# Altium schematic symbol library Analog Devices Data Converters Digital-to-Analog Converters.SchLib: 2231 symbols (part 84 of 135) (continued)
## AD5821ABCBZ-REEL (continued)
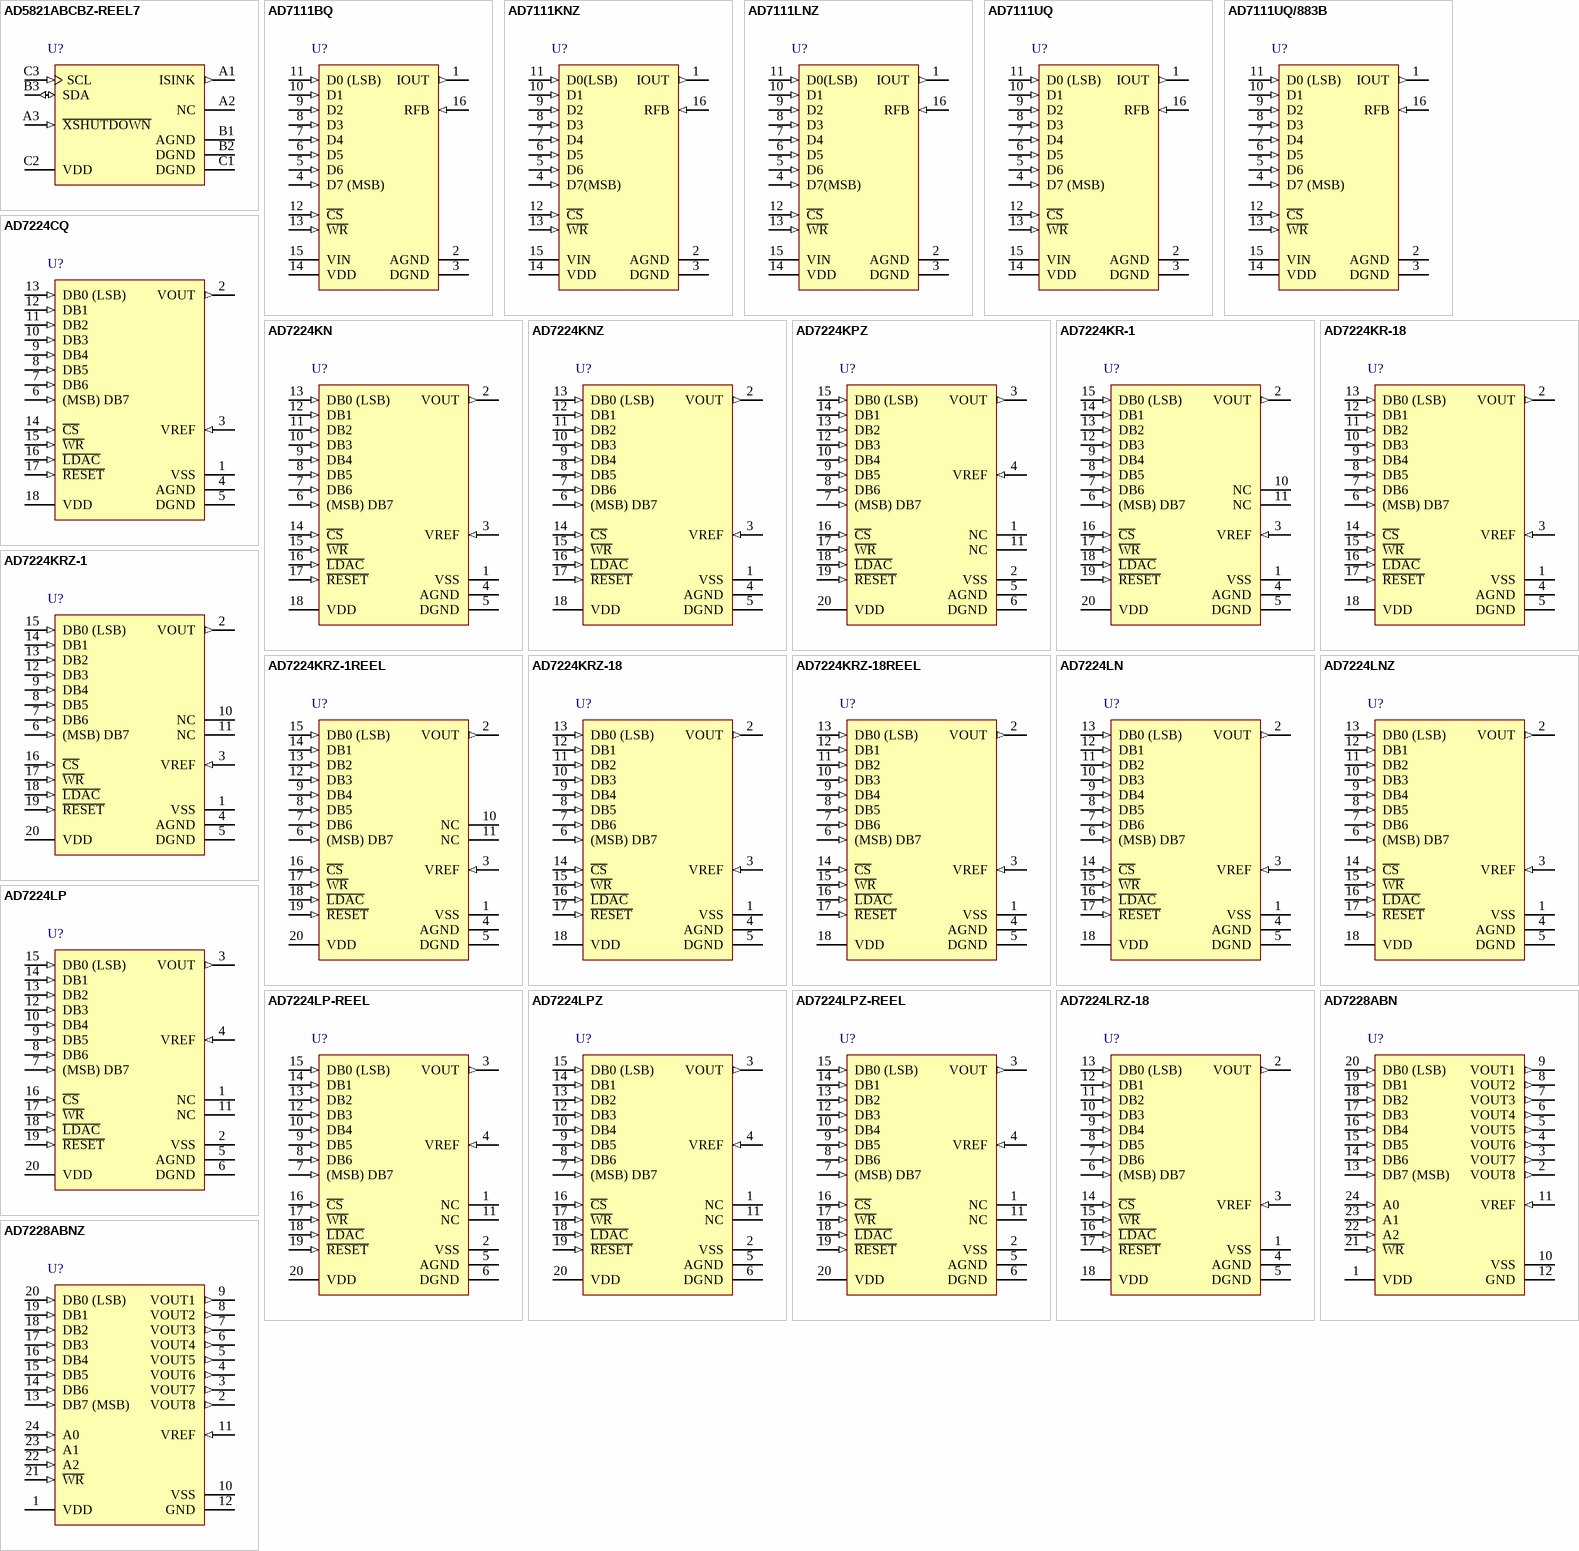
[diagram p58: symbols AD5821ABCBZ-REEL7 to AD7228ABNZ]

## AD5821ABCBZ-REEL7
designator U?
Single 10-Bit Current Sinking Digital-to-Analog Converter with I2C Interface, 120 mA, 0 to +70 degC, CB-9-1, Pb-Free, Reel; Generic Part Number: AD5821A; Manufacturer: Analog Devices; PartNumber: AD5821ABCBZ-REEL7; # DAC Outputs: 1; Max V+: 5.5V; Op Pwr Diss: 5mW; Resolution (Bits): 10; Settling Time: 250µs; DatasheetVersion: Rev.0; PackageVersion: 091306-B; PackageReference: CB-9-1; PackageDescription: 9-Ball Wafer Level Chip Scale Package [WLCSP]; Supplier 1: Digi-Key; Supplier Part Number 1: AD5821ABCBZ-REEL7TR-ND; Supplier 2: Digi-Key; Supplier Part Number 2: AD5821ABCBZ-REEL7CT-ND; Supplier 3: Digi-Key; Supplier Part Number 3: AD5821ABCBZ-REEL7DKR-ND; Supplier 4: Mouser; Supplier Part Number 4: 584-AD5821ABCBZ-R7; Packing: Reel; Product URL: www.analog.com/en/audiovideo-products/lens-driver-components/ad5821a/products/product.html; RoHS: Y; Single Supply: -; Mounting Technology: Surface Mount; ComponentLink1Description: Manufacturer URL; ComponentLink1URL: http://www.analog.com/en/index.html; ComponentLink2Description: Datasheet; ComponentLink2URL: http://www.analog.com/static/imported-files/data_sheets/AD5821A.pdf; ComponentLink3Description: Package Specification; ComponentLink3URL: http://www.analog.com/static/imported-files/packages/PKG_PDF/WLCSP(CB)/CB_9_1.pdf
footprint CB-9-1 (BGA, 9-Leads, Body 1.69x1.52mm, Pitch 0.5mm)
pins: A1 ISINK (out) "Output Current Sink.", A2 NC "No Connection.", A3 ~{XSHUTDOWN} (in) "Power-Down. Asynchronous power-down signal, active low.", B1 AGND (power) "Analog Ground Pin.", B2 DGND (power) "Digital Ground Pin", B3 SDA (io) "I2C Interface Signal", C1 DGND (power) "Digital Ground Pin.", C2 VDD (power) "Digital Supply Voltage.", C3 SCL (in) "I2C Interface Signal."

## AD7111BQ
designator U?
Single LC2MOS Logarithmic Digital-to-Analog Converter, -40 to +85 degC, Q-16, Tube; Generic Part Number: AD7111; Manufacturer: Analog Devices; PartNumber: AD7111BQ; # DAC Outputs: 1; Max V+: 5V; Op Pwr Diss: 10mW; Resolution (Bits): 17; Single Supply: Yes; DatasheetVersion: Rev.0; PackageVersion: 1996; PackageReference: Q-16; PackageDescription: DIP, 16-Pin, Skinny Dual In-line Package, 300mil Wide, Pitch 2.54 mm; Supplier 1: Digi-Key; Supplier Part Number 1: AD7111BQ-ND; Supplier 2: Mouser; Supplier Part Number 2: 584-AD7111BQ; Packing: Tube; RoHS: N; Mounting Technology: Through Hole; ComponentLink1Description: Manufacturer URL; ComponentLink1URL: http://www.analog.com/en/index.html; ComponentLink2Description: Datasheet; ComponentLink2URL: http://www.analog.com/static/imported-files/data_sheets/AD7111_7111A.pdf; ComponentLink3Description: Package Specification; ComponentLink3URL: http://www.analog.com/static/imported-files/packages/54083157002221Q_16.pdf; ComponentLink4Description: Product URL; ComponentLink4URL: http://www.analog.com/en/digital-to-analog-converters/da-converters/ad7111/products/product.html
footprint Q-16 (DIP, 16-Leads, Row Spacing 7.62mm, Pitch 2.54mm, Body 20.07x6.73mm)
pins: 1 IOUT (out), 2 AGND (power), 3 DGND (power), 4 D7 (MSB) (in), 5 D6 (in), 6 D5 (in), 7 D4 (in), 8 D3 (in), 9 D2 (in), 10 D1 (in), 11 D0 (LSB) (in), 12 ~{CS} (in), 13 ~{WR} (in), 14 VDD (power), 15 VIN (power), 16 RFB (in)

## AD7111KNZ
designator U?
Single LC2MOS Logarithmic Digital-to-Analog Converter, 0 to +70 degC, N-16, Pb-Free, Tube; Generic Part Number: AD7111; Manufacturer: Analog Devices; PartNumber: AD7111KNZ; # DAC Outputs: 1; Max V+: 5V; Op Pwr Diss: 10mW; Resolution (Bits): 17; Single Supply: Yes; DatasheetVersion: Rev.0; PackageVersion: 070706-A; PackageReference: N-16; PackageDescription: 16-Lead Plastic Dual In-Line Package [PDIP] Narrow Body; Supplier 1: Digi-Key; Supplier Part Number 1: AD7111KNZ-ND; Supplier 2: Mouser; Supplier Part Number 2: 584-AD7111KNZ; Packing: Tube; RoHS: Y; Mounting Technology: Through Hole; Code_JEDEC: MS-001; ComponentLink1Description: Manufacturer URL; ComponentLink1URL: http://www.analog.com/en/index.html; ComponentLink2Description: Datasheet; ComponentLink2URL: http://www.analog.com/static/imported-files/data_sheets/AD7111_7111A.pdf; ComponentLink3Description: Package Specification; ComponentLink3URL: http://www.analog.com/static/imported-files/packages/44768431550332N_16.pdf; ComponentLink4Description: Product URL; ComponentLink4URL: http://www.analog.com/en/digital-to-analog-converters/da-converters/ad7111/products/product.html
footprint N-16 (DIP, 16-Leads, Row Spacing 7.62mm, Pitch 2.54mm, Body 20.1x6.6mm)
pins: 1 IOUT (out), 2 AGND (power), 3 DGND (power), 4 D7(MSB) (in), 5 D6 (in), 6 D5 (in), 7 D4 (in), 8 D3 (in), 9 D2 (in), 10 D1 (in), 11 D0(LSB) (in), 12 ~{CS} (in), 13 ~{WR} (in), 14 VDD (power), 15 VIN (power), 16 RFB (in)

## AD7111LNZ
designator U?
Single LC2MOS Logarithmic Digital-to-Analog Converter, 0 to +70 degC, N-16, Pb-Free, Tube; Generic Part Number: AD7111; Manufacturer: Analog Devices; PartNumber: AD7111LNZ; # DAC Outputs: 1; Max V+: 5V; Op Pwr Diss: 10mW; Resolution (Bits): 17; Single Supply: Yes; DatasheetVersion: Rev.0; PackageVersion: 070706-A; PackageReference: N-16; PackageDescription: 16-Lead Plastic Dual In-Line Package [PDIP] Narrow Body; Supplier 1: Digi-Key; Supplier Part Number 1: AD7111LNZ-ND; Supplier 2: Newark; Supplier Part Number 2: 59K4547; Supplier 3: Mouser; Supplier Part Number 3: 584-AD7111LNZ; Packing: Tube; RoHS: Y; Mounting Technology: Through Hole; Code_JEDEC: MS-001; ComponentLink1Description: Manufacturer URL; ComponentLink1URL: http://www.analog.com/en/index.html; ComponentLink2Description: Datasheet; ComponentLink2URL: http://www.analog.com/static/imported-files/data_sheets/AD7111_7111A.pdf; ComponentLink3Description: Package Specification; ComponentLink3URL: http://www.analog.com/static/imported-files/packages/44768431550332N_16.pdf; ComponentLink4Description: Product URL; ComponentLink4URL: http://www.analog.com/en/digital-to-analog-converters/da-converters/ad7111/products/product.html
footprint N-16 (DIP, 16-Leads, Row Spacing 7.62mm, Pitch 2.54mm, Body 20.1x6.6mm)
pins: 1 IOUT (out), 2 AGND (power), 3 DGND (power), 4 D7(MSB) (in), 5 D6 (in), 6 D5 (in), 7 D4 (in), 8 D3 (in), 9 D2 (in), 10 D1 (in), 11 D0(LSB) (in), 12 ~{CS} (in), 13 ~{WR} (in), 14 VDD (power), 15 VIN (power), 16 RFB (in)

## AD7111UQ
designator U?
Single LC2MOS Logarithmic Digital-to-Analog Converter, -55 to +125 degC, Q-16, Tube; Generic Part Number: AD7111; Manufacturer: Analog Devices; PartNumber: AD7111UQ; # DAC Outputs: 1; Max V+: +5V; Op Pwr Diss: 10mW; Resolution (Bits): 17; Single Supply: Yes; DatasheetVersion: Rev.0; PackageVersion: 1996; PackageReference: Q-16; PackageDescription: DIP, 16-Pin, Skinny Dual In-line Package, 300mil Wide, Pitch 2.54 mm; Supplier 1: Mouser; Supplier Part Number 1: N/A; Packing: Tube; RoHS: N; Mounting Technology: Through Hole; ComponentLink1Description: Manufacturer URL; ComponentLink1URL: http://www.analog.com/en/index.html; ComponentLink2Description: Datasheet; ComponentLink2URL: http://www.analog.com/static/imported-files/data_sheets/AD7111_7111A.pdf; ComponentLink3Description: Package Specification; ComponentLink3URL: http://www.analog.com/static/imported-files/packages/54083157002221Q_16.pdf; ComponentLink4Description: Product URL; ComponentLink4URL: http://www.analog.com/en/digital-to-analog-converters/da-converters/ad7111/products/product.html
footprint Q-16 (DIP, 16-Leads, Row Spacing 7.62mm, Pitch 2.54mm, Body 20.07x6.73mm)
pins: 1 IOUT (out), 2 AGND (power), 3 DGND (power), 4 D7 (MSB) (in), 5 D6 (in), 6 D5 (in), 7 D4 (in), 8 D3 (in), 9 D2 (in), 10 D1 (in), 11 D0 (LSB) (in), 12 ~{CS} (in), 13 ~{WR} (in), 14 VDD (power), 15 VIN (power), 16 RFB (in)

## AD7111UQ/883B
designator U?
Single LC2MOS Logarithmic Digital-to-Analog Converter, -55 to +125 degC, Q-16, Tube; Generic Part Number: AD7111; Manufacturer: Analog Devices; PartNumber: AD7111UQ/883B; # DAC Outputs: 1; Max V+: 5V; Op Pwr Diss: 10mW; Resolution (Bits): 17; Single Supply: Yes; DatasheetVersion: Rev.0; PackageVersion: 1996; PackageReference: Q-16; PackageDescription: DIP, 16-Pin, Skinny Dual In-line Package, 300mil Wide, Pitch 2.54 mm; Supplier 1: Mouser; Supplier Part Number 1: 584-AD7111UQ883B; Packing: Tube; RoHS: N; Mounting Technology: Through Hole; ComponentLink1Description: Manufacturer URL; ComponentLink1URL: http://www.analog.com/en/index.html; ComponentLink2Description: Datasheet; ComponentLink2URL: http://www.analog.com/static/imported-files/data_sheets/AD7111_7111A.pdf; ComponentLink3Description: Package Specification; ComponentLink3URL: http://www.analog.com/static/imported-files/packages/54083157002221Q_16.pdf; ComponentLink4Description: Product URL; ComponentLink4URL: http://www.analog.com/en/digital-to-analog-converters/da-converters/ad7111/products/product.html
footprint Q-16 (DIP, 16-Leads, Row Spacing 7.62mm, Pitch 2.54mm, Body 20.07x6.73mm)
pins: 1 IOUT (out), 2 AGND (power), 3 DGND (power), 4 D7 (MSB) (in), 5 D6 (in), 6 D5 (in), 7 D4 (in), 8 D3 (in), 9 D2 (in), 10 D1 (in), 11 D0 (LSB) (in), 12 ~{CS} (in), 13 ~{WR} (in), 14 VDD (power), 15 VIN (power), 16 RFB (in)

## AD7224CQ
designator U?
Single 8-Bit LC2MOS Digital-to-Analog Converter with Output Amplifier, -40 to +85 degC, Q-18, Tube; Generic Part Number: AD7224; Manufacturer: Analog Devices; PartNumber: AD7224CQ; # DAC Outputs: 1; Max V+: 16.5V; Op Pwr Diss: 75mW; Resolution (Bits): 8; Settling Time: 7µs; Single Supply: Yes; DatasheetVersion: Rev.B; PackageReference: Q-18; PackageDescription: DIP, Ceramic, 18-Pin, Skinny Dual In-line Package, 300mil Wide, Pitch 2.54 mm; Supplier 1: Digi-Key; Supplier Part Number 1: AD7224CQ-ND; Supplier 2: Newark; Supplier Part Number 2: 66F4791; Supplier 3: Mouser; Supplier Part Number 3: 584-AD7224CQ; Packing: Tube; RoHS: N; Mounting Technology: Through Hole; ComponentLink1Description: Manufacturer URL; ComponentLink1URL: http://www.analog.com/en/index.html; ComponentLink2Description: Datasheet; ComponentLink2URL: http://www.analog.com/static/imported-files/data_sheets/AD7224.pdf; ComponentLink3Description: Package Specification; ComponentLink3URL: http://www.analog.com/static/imported-files/packages/3949539816247344490Q_18.pdf; ComponentLink4Description: Product URL; ComponentLink4URL: http://www.analog.com/en/digital-to-analog-converters/da-converters/ad7224/products/product.html
footprint Q-18 (DIP, 18-Leads, Row Spacing 7.62mm, Pitch 2.54mm, Body 24.13x6.73mm)
pins: 1 VSS (power), 2 VOUT (out), 3 VREF (in), 4 AGND (power), 5 DGND (power), 6 (MSB) DB7 (in), 7 DB6 (in), 8 DB5 (in), 9 DB4 (in), 10 DB3 (in), 11 DB2 (in), 12 DB1 (in), 13 DB0 (LSB) (in), 14 ~{CS} (in), 15 ~{WR} (in), 16 ~{LDAC} (in), 17 ~{RESET} (in), 18 VDD (power)

## AD7224KN
designator U?
Single 8-Bit LC2MOS Digital-to-Analog Converter with Output Amplifier, 0 to +70 degC, N-18, Tube; Generic Part Number: AD7224; Manufacturer: Analog Devices; PartNumber: AD7224KN; # DAC Outputs: 1; Max V+: 16.5V; Op Pwr Diss: 75mW; Resolution (Bits): 8; Settling Time: 7µs; Single Supply: Yes; DatasheetVersion: Rev.B; PackageVersion: 070706-A; PackageReference: N-18; PackageDescription: 18-Lead Plastic Dual In-Line Package [PDIP] Narrow Body; Supplier 1: Digi-Key; Supplier Part Number 1: AD7224KN-ND; Supplier 2: Mouser; Supplier Part Number 2: 584-AD7224KN; Packing: Tube; RoHS: N; Mounting Technology: Through Hole; Code_JEDEC: MS-001; ComponentLink1Description: Manufacturer URL; ComponentLink1URL: http://www.analog.com/en/index.html; ComponentLink2Description: Datasheet; ComponentLink2URL: http://www.analog.com/static/imported-files/data_sheets/AD7224.pdf; ComponentLink3Description: Package Specification; ComponentLink3URL: http://www.analog.com/static/imported-files/packages/44930452931834N_18.pdf; ComponentLink4Description: Product URL; ComponentLink4URL: http://www.analog.com/en/digital-to-analog-converters/da-converters/ad7224/products/product.html
footprint N-18 (DIP, 18-Leads, Row Spacing 7.62mm, Pitch 2.54mm, Body 22.9x6.6mm)
pins: 1 VSS (power), 2 VOUT (out), 3 VREF (in), 4 AGND (power), 5 DGND (power), 6 (MSB) DB7 (in), 7 DB6 (in), 8 DB5 (in), 9 DB4 (in), 10 DB3 (in), 11 DB2 (in), 12 DB1 (in), 13 DB0 (LSB) (in), 14 ~{CS} (in), 15 ~{WR} (in), 16 ~{LDAC} (in), 17 ~{RESET} (in), 18 VDD (power)

## AD7224KNZ
designator U?
Single 8-Bit LC2MOS Digital-to-Analog Converter with Output Amplifier, 0 to +70 degC, N-18, Pb-Free, Tube; Generic Part Number: AD7224; Manufacturer: Analog Devices; PartNumber: AD7224KNZ; # DAC Outputs: 1; Max V+: 16.5V; Op Pwr Diss: 75mW; Resolution (Bits): 8; Settling Time: 7µs; Single Supply: Yes; DatasheetVersion: Rev.B; PackageVersion: 070706-A; PackageReference: N-18; PackageDescription: 18-Lead Plastic Dual In-Line Package [PDIP] Narrow Body; Supplier 1: Digi-Key; Supplier Part Number 1: AD7224KNZ-ND; Supplier 2: Farnell; Supplier Part Number 2: 1438381; Supplier 3: Newark; Supplier Part Number 3: 59K4564; Supplier 4: Mouser; Supplier Part Number 4: 584-AD7224KNZ; Packing: Tube; RoHS: Y; Mounting Technology: Through Hole; Code_JEDEC: MS-001; ComponentLink1Description: Manufacturer URL; ComponentLink1URL: http://www.analog.com/en/index.html; ComponentLink2Description: Datasheet; ComponentLink2URL: http://www.analog.com/static/imported-files/data_sheets/AD7224.pdf; ComponentLink3Description: Package Specification; ComponentLink3URL: http://www.analog.com/static/imported-files/packages/44930452931834N_18.pdf; ComponentLink4Description: Product URL; ComponentLink4URL: http://www.analog.com/en/digital-to-analog-converters/da-converters/ad7224/products/product.html
footprint N-18 (DIP, 18-Leads, Row Spacing 7.62mm, Pitch 2.54mm, Body 22.9x6.6mm)
pins: 1 VSS (power), 2 VOUT (out), 3 VREF (in), 4 AGND (power), 5 DGND (power), 6 (MSB) DB7 (in), 7 DB6 (in), 8 DB5 (in), 9 DB4 (in), 10 DB3 (in), 11 DB2 (in), 12 DB1 (in), 13 DB0 (LSB) (in), 14 ~{CS} (in), 15 ~{WR} (in), 16 ~{LDAC} (in), 17 ~{RESET} (in), 18 VDD (power)

## AD7224KPZ
designator U?
Single 8-Bit LC2MOS Digital-to-Analog Converter with Output Amplifier, 0 to +70 degC, P-20A, Pb-Free, Tube; Generic Part Number: AD7224; Manufacturer: Analog Devices; PartNumber: AD7224KPZ; # DAC Outputs: 1; Max V+: 16.5V; Op Pwr Diss: 75mW; Resolution (Bits): 8; Settling Time: 7µs; Single Supply: Yes; DatasheetVersion: Rev.B; PackageVersion: Nov-2002; PackageReference: P-20A; PackageDescription: 20-Lead Plastic Leaded Chip Carrier [PLCC]; Supplier 1: Digi-Key; Supplier Part Number 1: AD7224KPZ-ND; Supplier 2: Mouser; Supplier Part Number 2: 584-AD7224KPZ; Packing: Tube; RoHS: Y; Mounting Technology: Surface Mount; Code_JEDEC: MO-047-AA; ComponentLink1Description: Manufacturer URL; ComponentLink1URL: http://www.analog.com/en/index.html; ComponentLink2Description: Datasheet; ComponentLink2URL: http://www.analog.com/static/imported-files/data_sheets/AD7224.pdf; ComponentLink3Description: Package Specification; ComponentLink3URL: http://www.analog.com/static/imported-files/packages/3121431516544404277643669223804694P20A.pdf; ComponentLink4Description: Product URL; ComponentLink4URL: http://www.analog.com/en/digital-to-analog-converters/da-converters/ad7224/products/product.html
footprint P-20A_N (Leaded Chip Carrier, 20-Leads, Body 9x9mm, Pitch 1.27mm, IPC Medium Density)
footprint P-20A_L (Leaded Chip Carrier, 20-Leads, Body 9x9mm, Pitch 1.27mm, IPC High Density)
footprint P-20A_M (Leaded Chip Carrier, 20-Leads, Body 9x9mm, Pitch 1.27mm, IPC Low Density)
pins: 1 NC, 2 VSS (power), 3 VOUT (out), 4 VREF (in), 5 AGND (power), 6 DGND (power), 7 (MSB) DB7 (in), 8 DB6 (in), 9 DB5 (in), 10 DB4 (in), 11 NC, 12 DB3 (in), 13 DB2 (in), 14 DB1 (in), 15 DB0 (LSB) (in), 16 ~{CS} (in), 17 ~{WR} (in), 18 ~{LDAC} (in), 19 ~{RESET} (in), 20 VDD (power)

## AD7224KR-1
designator U?
Single 8-Bit LC2MOS Digital-to-Analog Converter with Output Amplifier, 0 to +70 degC, RW-20, Tube; Generic Part Number: AD7224; Manufacturer: Analog Devices; PartNumber: AD7224KR-1; # DAC Outputs: 1; Max V+: 16.5V; Op Pwr Diss: 75mW; Resolution (Bits): 8; Settling Time: 7µs; Single Supply: Yes; DatasheetVersion: Rev.B; PackageVersion: 060706-A; PackageReference: RW-20; PackageDescription: 20-Lead Standard Small Outline Package [SOIC_W] Wide Body; Supplier 1: Digi-Key; Supplier Part Number 1: AD7224KR-1-ND; Supplier 2: Mouser; Supplier Part Number 2: 584-AD7224KR-1; Packing: Tube; RoHS: N; Mounting Technology: Surface Mount; Code_JEDEC: MS-013-AC; ComponentLink1Description: Manufacturer URL; ComponentLink1URL: http://www.analog.com/en/index.html; ComponentLink2Description: Datasheet; ComponentLink2URL: http://www.analog.com/static/imported-files/data_sheets/AD7224.pdf; ComponentLink3Description: Package Specification; ComponentLink3URL: http://www.analog.com/static/imported-files/packages/233848RW_20.pdf; ComponentLink4Description: Product URL; ComponentLink4URL: http://www.analog.com/en/digital-to-analog-converters/da-converters/ad7224/products/product.html
footprint RW-20_N (SOIC, 20-Leads, Body 12.8x7.5mm, Pitch 1.27mm, IPC Medium Density)
footprint RW-20_L (SOIC, 20-Leads, Body 12.8x7.5mm, Pitch 1.27mm, IPC High Density)
footprint RW-20_M (SOIC, 20-Leads, Body 12.8x7.5mm, Pitch 1.27mm, IPC Low Density)
pins: 1 VSS (power), 2 VOUT (out), 3 VREF (in), 4 AGND (power), 5 DGND (power), 6 (MSB) DB7 (in), 7 DB6 (in), 8 DB5 (in), 9 DB4 (in), 10 NC, 11 NC, 12 DB3 (in), 13 DB2 (in), 14 DB1 (in), 15 DB0 (LSB) (in), 16 ~{CS} (in), 17 ~{WR} (in), 18 ~{LDAC} (in), 19 ~{RESET} (in), 20 VDD (power)

## AD7224KR-18
designator U?
Single 8-Bit LC2MOS Digital-to-Analog Converter with Output Amplifier, 0 to +70 degC, RW-18, Tube; Generic Part Number: AD7224; Manufacturer: Analog Devices; PartNumber: AD7224KR-18; # DAC Outputs: 1; Max V+: 16.5V; Op Pwr Diss: 75mW; Resolution (Bits): 8; Settling Time: 7µs; Single Supply: Yes; DatasheetVersion: Rev.B; PackageVersion: 060706-A; PackageReference: RW-18; PackageDescription: 18-Lead Standard Small Outline Package [SOIC_W] Wide Body; Supplier 1: Digi-Key; Supplier Part Number 1: AD7224KR-18-ND; Supplier 2: Newark; Supplier Part Number 2: 66F5834; Supplier 3: Mouser; Supplier Part Number 3: 584-AD7224KR-18; Packing: Tube; RoHS: N; Mounting Technology: Surface Mount; Code_JEDEC: MS-013-AB; ComponentLink1Description: Manufacturer URL; ComponentLink1URL: http://www.analog.com/en/index.html; ComponentLink2Description: Datasheet; ComponentLink2URL: http://www.analog.com/static/imported-files/data_sheets/AD7224.pdf; ComponentLink3Description: Package Specification; ComponentLink3URL: http://www.analog.com/static/imported-files/packages/33254132129439RW_18.pdf; ComponentLink4Description: Product URL; ComponentLink4URL: http://www.analog.com/en/digital-to-analog-converters/da-converters/ad7224/products/product.html
footprint RW-18_N (SOIC, 18-Leads, Body 11.6x7.5mm, Pitch 1.27mm, IPC Medium Density)
footprint RW-18_L (SOIC, 18-Leads, Body 11.6x7.5mm, Pitch 1.27mm, IPC High Density)
footprint RW-18_M (SOIC, 18-Leads, Body 11.6x7.5mm, Pitch 1.27mm, IPC Low Density)
pins: 1 VSS (power), 2 VOUT (out), 3 VREF (in), 4 AGND (power), 5 DGND (power), 6 (MSB) DB7 (in), 7 DB6 (in), 8 DB5 (in), 9 DB4 (in), 10 DB3 (in), 11 DB2 (in), 12 DB1 (in), 13 DB0 (LSB) (in), 14 ~{CS} (in), 15 ~{WR} (in), 16 ~{LDAC} (in), 17 ~{RESET} (in), 18 VDD (power)

## AD7224KRZ-1
designator U?
Single 8-Bit LC2MOS Digital-to-Analog Converter with Output Amplifier, 0 to +70 degC, RW-20, Pb-Free, Tube; Generic Part Number: AD7224; Manufacturer: Analog Devices; PartNumber: AD7224KRZ-1; # DAC Outputs: 1; Max V+: 16.5V; Op Pwr Diss: 75mW; Resolution (Bits): 8; Settling Time: 7µs; Single Supply: Yes; DatasheetVersion: Rev.B; PackageVersion: 060706-A; PackageReference: RW-20; PackageDescription: 20-Lead Standard Small Outline Package [SOIC_W] Wide Body; Supplier 1: Digi-Key; Supplier Part Number 1: AD7224KRZ-1-ND; Supplier 2: Newark; Supplier Part Number 2: 87H9974; Supplier 3: Mouser; Supplier Part Number 3: 584-AD7224KRZ-1; Packing: Tube; RoHS: Y; Mounting Technology: Surface Mount; Code_JEDEC: MS-013-AC; ComponentLink1Description: Manufacturer URL; ComponentLink1URL: http://www.analog.com/en/index.html; ComponentLink2Description: Datasheet; ComponentLink2URL: http://www.analog.com/static/imported-files/data_sheets/AD7224.pdf; ComponentLink3Description: Package Specification; ComponentLink3URL: http://www.analog.com/static/imported-files/packages/233848RW_20.pdf; ComponentLink4Description: Product URL; ComponentLink4URL: http://www.analog.com/en/digital-to-analog-converters/da-converters/ad7224/products/product.html
footprint RW-20_N (SOIC, 20-Leads, Body 12.8x7.5mm, Pitch 1.27mm, IPC Medium Density)
footprint RW-20_L (SOIC, 20-Leads, Body 12.8x7.5mm, Pitch 1.27mm, IPC High Density)
footprint RW-20_M (SOIC, 20-Leads, Body 12.8x7.5mm, Pitch 1.27mm, IPC Low Density)
pins: 1 VSS (power), 2 VOUT (out), 3 VREF (in), 4 AGND (power), 5 DGND (power), 6 (MSB) DB7 (in), 7 DB6 (in), 8 DB5 (in), 9 DB4 (in), 10 NC, 11 NC, 12 DB3 (in), 13 DB2 (in), 14 DB1 (in), 15 DB0 (LSB) (in), 16 ~{CS} (in), 17 ~{WR} (in), 18 ~{LDAC} (in), 19 ~{RESET} (in), 20 VDD (power)

## AD7224KRZ-1REEL
designator U?
Single 8-Bit LC2MOS Digital-to-Analog Converter with Output Amplifier, 0 to +70 degC, RW-20, Pb-Free, Reel; Generic Part Number: AD7224; Manufacturer: Analog Devices; PartNumber: AD7224KRZ-1REEL; # DAC Outputs: 1; Max V+: 16.5V; Op Pwr Diss: 75mW; Resolution (Bits): 8; Settling Time: 7µs; Single Supply: Yes; DatasheetVersion: Rev.B; PackageVersion: 060706-A; PackageReference: RW-20; PackageDescription: 20-Lead Standard Small Outline Package [SOIC_W] Wide Body; Supplier 1: Digi-Key; Supplier Part Number 1: AD7224KRZ-1REELTR-ND; Supplier 2: Digi-Key; Supplier Part Number 2: AD7224KRZ-1REELCT-ND; Supplier 3: Digi-Key; Supplier Part Number 3: AD7224KRZ-1REELDKR-ND; Supplier 4: Newark; Supplier Part Number 4: 02P7474; Supplier 5: Mouser; Supplier Part Number 5: 584-AD7224KRZ-1R; Packing: Reel; RoHS: Y; Mounting Technology: Surface Mount; Code_JEDEC: MS-013-AC; ComponentLink1Description: Manufacturer URL; ComponentLink1URL: http://www.analog.com/en/index.html; ComponentLink2Description: Datasheet; ComponentLink2URL: http://www.analog.com/static/imported-files/data_sheets/AD7224.pdf; ComponentLink3Description: Package Specification; ComponentLink3URL: http://www.analog.com/static/imported-files/packages/233848RW_20.pdf; ComponentLink4Description: Product URL; ComponentLink4URL: http://www.analog.com/en/digital-to-analog-converters/da-converters/ad7224/products/product.html
footprint RW-20_N (SOIC, 20-Leads, Body 12.8x7.5mm, Pitch 1.27mm, IPC Medium Density)
footprint RW-20_L (SOIC, 20-Leads, Body 12.8x7.5mm, Pitch 1.27mm, IPC High Density)
footprint RW-20_M (SOIC, 20-Leads, Body 12.8x7.5mm, Pitch 1.27mm, IPC Low Density)
pins: 1 VSS (power), 2 VOUT (out), 3 VREF (in), 4 AGND (power), 5 DGND (power), 6 (MSB) DB7 (in), 7 DB6 (in), 8 DB5 (in), 9 DB4 (in), 10 NC, 11 NC, 12 DB3 (in), 13 DB2 (in), 14 DB1 (in), 15 DB0 (LSB) (in), 16 ~{CS} (in), 17 ~{WR} (in), 18 ~{LDAC} (in), 19 ~{RESET} (in), 20 VDD (power)

## AD7224KRZ-18
designator U?
Single 8-Bit LC2MOS Digital-to-Analog Converter with Output Amplifier, 0 to +70 degC, RW-18, Pb-Free, Tube; Generic Part Number: AD7224; Manufacturer: Analog Devices; PartNumber: AD7224KRZ-18; # DAC Outputs: 1; Max V+: 16.5V; Op Pwr Diss: 75mW; Resolution (Bits): 8; Settling Time: 7µs; Single Supply: Yes; DatasheetVersion: Rev.B; PackageVersion: 060706-A; PackageReference: RW-18; PackageDescription: 18-Lead Standard Small Outline Package [SOIC_W] Wide Body; Supplier 1: Digi-Key; Supplier Part Number 1: AD7224KRZ-18-ND; Supplier 2: Mouser; Supplier Part Number 2: 584-AD7224KRZ-18; Packing: Tube; RoHS: Y; Mounting Technology: Surface Mount; Code_JEDEC: MS-013-AB; ComponentLink1Description: Manufacturer URL; ComponentLink1URL: http://www.analog.com/en/index.html; ComponentLink2Description: Datasheet; ComponentLink2URL: http://www.analog.com/static/imported-files/data_sheets/AD7224.pdf; ComponentLink3Description: Package Specification; ComponentLink3URL: http://www.analog.com/static/imported-files/packages/33254132129439RW_18.pdf; ComponentLink4Description: Product URL; ComponentLink4URL: http://www.analog.com/en/digital-to-analog-converters/da-converters/ad7224/products/product.html
footprint RW-18_N (SOIC, 18-Leads, Body 11.6x7.5mm, Pitch 1.27mm, IPC Medium Density)
footprint RW-18_L (SOIC, 18-Leads, Body 11.6x7.5mm, Pitch 1.27mm, IPC High Density)
footprint RW-18_M (SOIC, 18-Leads, Body 11.6x7.5mm, Pitch 1.27mm, IPC Low Density)
pins: 1 VSS (power), 2 VOUT (out), 3 VREF (in), 4 AGND (power), 5 DGND (power), 6 (MSB) DB7 (in), 7 DB6 (in), 8 DB5 (in), 9 DB4 (in), 10 DB3 (in), 11 DB2 (in), 12 DB1 (in), 13 DB0 (LSB) (in), 14 ~{CS} (in), 15 ~{WR} (in), 16 ~{LDAC} (in), 17 ~{RESET} (in), 18 VDD (power)

## AD7224KRZ-18REEL
designator U?
Single 8-Bit LC2MOS Digital-to-Analog Converter with Output Amplifier, 0 to +70 degC, RW-18, Pb-Free, Reel; Generic Part Number: AD7224; Manufacturer: Analog Devices; PartNumber: AD7224KRZ-18REEL; # DAC Outputs: 1; Max V+: 16.5V; Op Pwr Diss: 75mW; Resolution (Bits): 8; Settling Time: 7µs; Single Supply: Yes; DatasheetVersion: Rev.B; PackageVersion: 060706-A; PackageReference: RW-18; PackageDescription: 18-Lead Standard Small Outline Package [SOIC_W] Wide Body; Supplier 1: Digi-Key; Supplier Part Number 1: AD7224KRZ-18REEL-ND; Supplier 2: Mouser; Supplier Part Number 2: 584-AD7224KRZ-18R; Packing: Reel; RoHS: Y; Mounting Technology: Surface Mount; Code_JEDEC: MS-013-AB; ComponentLink1Description: Manufacturer URL; ComponentLink1URL: http://www.analog.com/en/index.html; ComponentLink2Description: Datasheet; ComponentLink2URL: http://www.analog.com/static/imported-files/data_sheets/AD7224.pdf; ComponentLink3Description: Package Specification; ComponentLink3URL: http://www.analog.com/static/imported-files/packages/33254132129439RW_18.pdf; ComponentLink4Description: Product URL; ComponentLink4URL: http://www.analog.com/en/digital-to-analog-converters/da-converters/ad7224/products/product.html
footprint RW-18_N (SOIC, 18-Leads, Body 11.6x7.5mm, Pitch 1.27mm, IPC Medium Density)
footprint RW-18_L (SOIC, 18-Leads, Body 11.6x7.5mm, Pitch 1.27mm, IPC High Density)
footprint RW-18_M (SOIC, 18-Leads, Body 11.6x7.5mm, Pitch 1.27mm, IPC Low Density)
pins: 1 VSS (power), 2 VOUT (out), 3 VREF (in), 4 AGND (power), 5 DGND (power), 6 (MSB) DB7 (in), 7 DB6 (in), 8 DB5 (in), 9 DB4 (in), 10 DB3 (in), 11 DB2 (in), 12 DB1 (in), 13 DB0 (LSB) (in), 14 ~{CS} (in), 15 ~{WR} (in), 16 ~{LDAC} (in), 17 ~{RESET} (in), 18 VDD (power)
